# Altium footprint library lib.PcbLib: 145 footprints (part 7 of 10)
Each footprint in its own frame and in the unit in brackets; x right, y up, seen from the top. Pads: shape width x height; smd on the part's side, far side on the other; paste and mask are expansions set on the pad; w line width, h text height; cw(c..) or ccw(c..) is an arc to the next point about the centre after c.
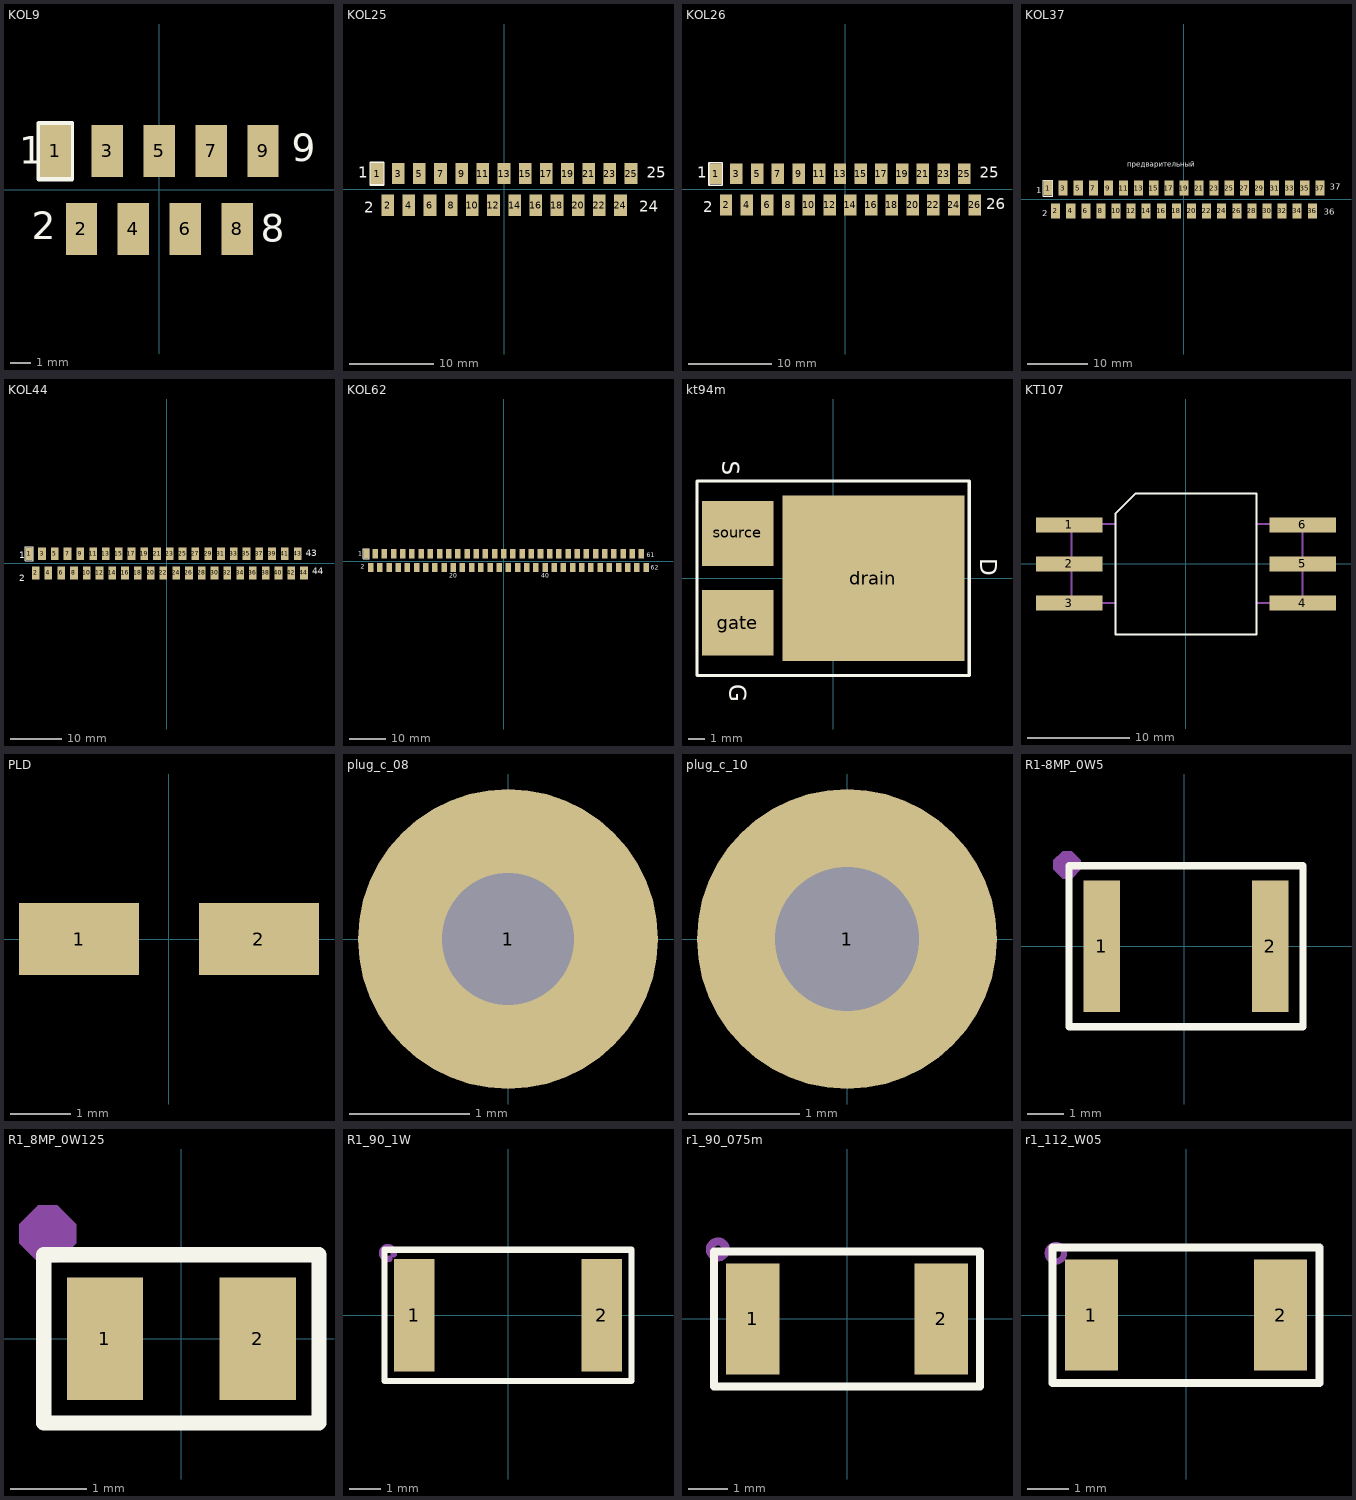
[diagram p6: the footprints below, top view; thin cyan lines are the x and y axes]

## KOL9 [mm]
pads (9):
  rect 1.5x2.5 smd: 1(-5,1.875) 2(-3.75,-1.875) 3(-2.5,1.875) 4(-1.25,-1.875) 5(0,1.875) 6(1.25,-1.875) 7(2.5,1.875) 8(3.75,-1.875) 9(5,1.875)
Top Overlay:
  lines w0.2: -5.8,0.515 -4.2,0.515 -4.2,3.215 -5.8,3.215 -5.8,0.515
  text "2" at -6.125,-2.375 h1.31
  text "9" at 6.375,1.375 h1.31
  text "1" at -6.75,1.25 h1.31
  text "8" at 4.875,-2.5 h1.31
Mechanical 25:
  text "8" at 5,-2.5 h2
  text "9" at 6.125,1.5 h2
  text "2" at -5.625,-2.5 h2
  text "1" at -6.625,1.125 h2

## KOL25 [mm]
pads (25):
  rect 1.5x2.5 smd: 1(-15,1.875) 2(-13.75,-1.875) 3(-12.5,1.875) 4(-11.25,-1.875) 5(-10,1.875) 6(-8.75,-1.875) 7(-7.5,1.875) 8(-6.25,-1.875) 9(-5,1.875) 10(-3.75,-1.875) 11(-2.5,1.875) 12(-1.25,-1.875) 13(0,1.875) 14(1.25,-1.875) 15(2.5,1.875) 16(3.75,-1.875) 17(5,1.875) 18(6.25,-1.875) 19(7.5,1.875) 20(8.75,-1.875) 21(10,1.875) 22(11.25,-1.875) 23(12.5,1.875) 24(13.75,-1.875) 25(15,1.875)
Top Overlay:
  lines w0.2: -15.8,0.515 -15.8,3.215 -14.2,3.215 -14.2,0.515 -15.8,0.515
  text "24" at 16,-2.625 h1.31
  text "1" at -17.25,1.375 h1.31
  text "25" at 16.875,1.375 h1.31
  text "2" at -16.5,-2.75 h1.31
Mechanical 25:
  text "2" at -16,-2.625 h2
  text "25" at 17.125,1.125 h2
  text "1" at -17.25,1.625 h2
  text "24" at 15.375,-2.625 h2

## KOL26 [mm]
pads (26):
  rect 1.5x2.5 smd: 1(-15.625,1.875) 2(-14.375,-1.875) 3(-13.125,1.875) 4(-11.875,-1.875) 5(-10.625,1.875) 6(-9.375,-1.875) 7(-8.125,1.875) 8(-6.875,-1.875) 9(-5.625,1.875) 10(-4.375,-1.875) 11(-3.125,1.875) 12(-1.875,-1.875) 13(-0.625,1.875) 14(0.625,-1.875) 15(1.875,1.875) 16(3.125,-1.875) 17(4.375,1.875) 18(5.625,-1.875) 19(6.875,1.875) 20(8.125,-1.875) 21(9.375,1.875) 22(10.625,-1.875) 23(11.875,1.875) 24(13.125,-1.875) 25(14.375,1.875) 26(15.625,-1.875)
Top Overlay:
  lines w0.2: -16.425,0.515 -14.825,0.515 -14.825,3.215 -16.425,3.215 -16.425,0.515
  text "2" at -17.125,-2.75 h1.31
  text "25" at 16.25,1.375 h1.31
  text "1" at -17.875,1.375 h1.31
  text "26" at 17,-2.375 h1.31
Mechanical 25:
  text "26" at 17.125,-2.375 h2
  text "1" at -17.875,1.625 h2
  text "25" at 16.5,1.125 h2
  text "2" at -16.625,-2.625 h2

## KOL37 [mm]
pads (37):
  rect 1.5x2.5 smd: 1(-22.5,1.875) 2(-21.25,-1.875) 3(-20,1.875) 4(-18.75,-1.875) 5(-17.5,1.875) 6(-16.25,-1.875) 7(-15,1.875) 8(-13.75,-1.875) 9(-12.5,1.875) 10(-11.25,-1.875) 11(-10,1.875) 12(-8.75,-1.875) 13(-7.5,1.875) 14(-6.25,-1.875) 15(-5,1.875) 16(-3.75,-1.875) 17(-2.5,1.875) 18(-1.25,-1.875) 19(0,1.875) 20(1.25,-1.875) 21(2.5,1.875) 22(3.75,-1.875) 23(5,1.875) 24(6.25,-1.875) 25(7.5,1.875) 26(8.75,-1.875) 27(10,1.875) 28(11.25,-1.875) 29(12.5,1.875) 30(13.75,-1.875) 31(15,1.875) 32(16.25,-1.875) 33(17.5,1.875) 34(18.75,-1.875) 35(20,1.875) 36(21.25,-1.875) 37(22.5,1.875)
Top Overlay:
  lines w0.2: -23.3,0.515 -21.7,0.515 -21.7,3.215 -23.3,3.215 -23.3,0.515
  text "2" at -23.5,-2.8 h1
  text "37" at 24.175,1.6 h1
  text "1" at -24.5,1 h1
  text "36" at 23.125,-2.5 h1
  text "предварительный" at -9.4,5.1 h1.5
Mechanical 25:
  text "1" at -24.35,1 h2
  text "2" at -23.5,-2.85 h2
  text "37" at 23.825,1.55 h2
  text "36" at 23.025,-2.55 h2

## KOL44 [mm]
pads (44):
  rect 1.5x2.5 smd: 1(-26.875,1.875) 2(-25.625,-1.875) 3(-24.375,1.875) 4(-23.125,-1.875) 5(-21.875,1.875) 6(-20.625,-1.875) 7(-19.375,1.875) 8(-18.125,-1.875) 9(-16.875,1.875) 10(-15.625,-1.875) 11(-14.375,1.875) 12(-13.125,-1.875) 13(-11.875,1.875) 14(-10.625,-1.875) 15(-9.375,1.875) 16(-8.125,-1.875) 17(-6.875,1.875) 18(-5.625,-1.875) 19(-4.375,1.875) 20(-3.125,-1.875) 21(-1.875,1.875) 22(-0.625,-1.875) 23(0.625,1.875) 24(1.875,-1.875) 25(3.125,1.875) 26(4.375,-1.875) 27(5.625,1.875) 28(6.875,-1.875) 29(8.125,1.875) 30(9.375,-1.875) 31(10.625,1.875) 32(11.875,-1.875) 33(13.125,1.875) 34(14.375,-1.875) 35(15.625,1.875) 36(16.875,-1.875) 37(18.125,1.875) 38(19.375,-1.875) 39(20.625,1.875) 40(21.875,-1.875) 41(23.125,1.875) 42(24.375,-1.875) 43(25.625,1.875) 44(26.875,-1.875)
Top Overlay:
  lines w0.2: -27.675,0.515 -27.675,3.215 -26.075,3.215 -26.075,0.515 -27.675,0.515
  text "44" at 28.5,-2.125 h1.31
  text "1" at -28.875,1 h1.31
  text "43" at 27.25,1.375 h1.31
  text "2" at -28.837,-3.473 h1.31
Mechanical 25:
  text "44" at 28.5,-2.625 h2
  text "43" at 27.75,0.875 h2
  text "2" at -28.537,-3.473 h2
  text "1" at -28.875,0.25 h2

## KOL62 [mm]
pads (62):
  rect 1.5x2.5 smd: 1(-37.5,2) 2(-36.25,-1.75) 3(-35,2) 4(-33.75,-1.75) 5(-32.5,2) 6(-31.25,-1.75) 7(-30,2) 8(-28.75,-1.75) 9(-27.5,2) 10(-26.25,-1.75) 11(-25,2) 12(-23.75,-1.75) 13(-22.5,2) 14(-21.25,-1.75) 15(-20,2) 16(-18.75,-1.75) 17(-17.5,2) 18(-16.25,-1.75) 19(-15,2) 20(-13.75,-1.75) 21(-12.5,2) 22(-11.25,-1.75) 23(-10,2) 24(-8.75,-1.75) 25(-7.5,2) 26(-6.25,-1.75) 27(-5,2) 28(-3.75,-1.75) 29(-2.5,2) 30(-1.25,-1.75) 31(0,2) 32(1.25,-1.75) 33(2.5,2) 34(3.75,-1.75) 35(5,2) 36(6.25,-1.75) 37(7.5,2) 38(8.75,-1.75) 39(10,2) 40(11.25,-1.75) 41(12.5,2) 42(13.75,-1.75) 43(15,2) 44(16.25,-1.75) 45(17.5,2) 46(18.75,-1.75) 47(20,2) 48(21.25,-1.75) 49(22.5,2) 50(23.75,-1.75) 51(25,2) 52(26.25,-1.75) 53(27.5,2) 54(28.75,-1.75) 55(30,2) 56(31.25,-1.75) 57(32.5,2) 58(33.75,-1.75) 59(35,2) 60(36.25,-1.75) 61(37.5,2) 62(38.75,-1.75)
Top Overlay:
  lines w0.2: -38.3,0.64 -36.7,0.64 -36.7,3.34 -38.3,3.34 -38.3,0.64
  text "2" at -38.9,-2.5 h2
  text "61" at 38.981,0.653 h2
  text "1" at -39.7,1.1 h2
  text "62" at 40,-2.75 h2
  text "20" at -14.9,-4.9 h2
  text "40" at 10.2,-4.9 h2
Mechanical 25:
  text "62" at 40.3,-2.75 h2
  text "1" at -39.3,0.7 h2
  text "61" at 39.281,0.653 h2
  text "2" at -38.6,-2.7 h2
  text "20" at -14.7,-4.8 h2
  text "40" at 10.2,-4.8 h2

## kt94m [mm] "2ПЕ209Б9,2П790А92"
height 3.6
pads (3):
  rect 10.85x9.85 smd: drain(2.4,0)
  rect 4.25x3.9 smd: gate(-5.7,-2.665) source(-5.7,2.665)
Top Overlay:
  lines w0.2: -8.125,-5.8 -8.125,5.8 8.125,5.8 8.125,-5.8 -8.125,-5.8
  text "D" at 8.773,1.194 h1
  text "S" at -6.622,7.021 h1
  text "G" at -6.2,-6.325 h1
Top Paste:
  rectangle: 0.85,0.25 3.85,4.25
  rectangle: 4.35,0.25 7.35,4.25
  rectangle: 4.35,-4.25 7.35,-0.25
  rectangle: 0.85,-4.25 3.85,-0.25
  rectangle: -2.65,0.25 0.35,4.25
  rectangle: -2.65,-4.25 0.35,-0.25
Mechanical 25:
  text "D" at 8.65,1.4 h1.5
  text "S" at -6.512,5.701 h1.5
  text "G" at -6.1,-5.25 h1.5
3D body: height 2.6, standoff 0.4, extent -8,-5.8 8,5.8
3D body: height 0.4, standoff 0, extent -3,-4.8 7.6,4.8
3D body: height 0.4, standoff 0, extent -7.7,0.7 -3.6,4.4
3D body: height 0.4, standoff 0, extent -7.7,-4.4 -3.6,-0.7

## KT107 [mm] "postavka_formovannaya(249КП23Т_ручная_пайка)"
height 6.6
pads (6):
  rect 6.5x1.5 smd: 1(-11.4,3.81) 2(-11.4,0) 3(-11.4,-3.81) 4(11.4,-3.81) 5(11.4,0) 6(11.4,3.81)
Top Overlay:
  lines w0.2: -4.7,6.9 -4.9,6.9 ; -6.9,4.9 -4.9,6.9 ; -6.9,4.9 -6.9,-6.9 6.9,-6.9 6.9,6.9 -4.9,6.9 ; -6.9,4.9 -4.9,6.9
Mechanical 5:
  lines w0.2: -6.9,-3.8 -11.2,-3.8 -11.2,3.9 -6.9,3.9 ; 6.9,-3.8 11.4,-3.8 11.4,3.9 6.9,3.9
Mechanical 25:
  text "6" at 7.125,3.5 h2
  text "4" at 7.025,-4.1 h2
  text "3" at -7.6,-4.125 h2
  text "1" at -7.6,3.525 h2
3D body "CFP381P2730X660-6N.step": height 6.6, standoff 0, extent -13.7,-6.92 13.7,6.92

## PLD [mm]
pads (2):
  rect 2x1.2 smd: 1(-1.5,0) 2(1.5,0)
Mechanical 25:
  text "1" at -0.8,-1.5 h2
  text "2" at 2.3,-1.8 h2

## plug_c_08 [mm] "штырь 0.8 ГОСТ16840-78"
height 6.5
pads (1):
  round 2.5 hole 1.1: 1(0,0)
3D body: height 6.5, standoff 0, extent -0.397,-0.399 0.4,0.399

## plug_c_10 [mm] "штырь 1.0мм ГОСТ16840-78"
height 6.5
pads (1):
  round 2.7 hole 1.3: 1(0,0)
3D body: height 6.5, standoff 0, extent -0.397,-0.399 0.4,0.399

## R1-8MP_0W5 [mm]
height 0.9
pads (2):
  rect 1x3.6 smd: 1(-2.25,0) 2(2.35,0)
Top Overlay:
  lines w0.2: -3.15,-2.2 3.25,-2.2 3.25,2.2 -3.15,2.2 -3.15,-2.2
Mechanical 25:
  region: -2.825,2.35 -3.075,2.6 -3.325,2.6 -3.575,2.35 -3.575,2.1 -3.325,1.85 -3.075,1.85 -2.825,2.1
3D body: height 0.9, standoff 0, extent -2.3,-1.6 2.3,1.6

## R1_8MP_0W125 [mm]
height 0.9
pads (2):
  rect 1x1.6 smd: 1(-1,0) 2(1,0)
Top Overlay:
  lines w0.2: -1.8,-1.1 -1.8,1.1 1.8,1.1 1.8,-1.1 -1.8,-1.1
Mechanical 25:
  region: -2.125,1.25 -1.875,1 -1.625,1 -1.375,1.25 -1.375,1.5 -1.625,1.75 -1.875,1.75 -2.125,1.5
3D body: height 0.9, standoff 0, extent -1,-0.7 1,0.7

## R1_90_1W [mm] "massa 0.04"
height 0.65
pads (2):
  rect 1.3x3.6 smd: 1(-3,0) 2(3,0)
Top Overlay:
  lines w0.2: -3.95,-2.1 -3.95,2.1 3.95,2.1 3.95,-2.1 -3.95,-2.1
Mechanical 25:
  lines w0.2: -3.793,1.808 cw(c-3.842,1.993) -3.655,1.957

## r1_90_075m [mm]
height 0.65
pads (2):
  rect 1.35x2.8 smd: 1(-2.375,0) 2(2.375,0)
Top Overlay:
  lines w0.2: -3.35,-1.7 3.35,-1.7 3.35,1.7 -3.35,1.7 -3.35,-1.7
Mechanical 25:
  circle w0.2: c-3.25,1.75 r0.2

## r1_112_W05 [mm]
height 0.8
pads (2):
  rect 1.3x2.7 smd: 1(-2.3,0) 2(2.3,0)
Top Overlay:
  lines w0.2: -3.25,-1.65 -3.25,1.65 3.25,1.65 3.25,-1.65 -3.25,-1.65
Mechanical 25:
  circle w0.15: c-3.167,1.507 r0.2
3D body: height 0.6, standoff 0, extent -2.5,-1.3 2.5,1.3